# Altium footprint library ref-packages.PCBLIB: 1544 footprints (part 78 of 103)
Each footprint in its own frame and in the unit in brackets; x right, y up, seen from the top. Pads: shape width x height; smd on the part's side, far side on the other; paste and mask are expansions set on the pad; w line width, h text height; cw(c..) or ccw(c..) is an arc to the next point about the centre after c.
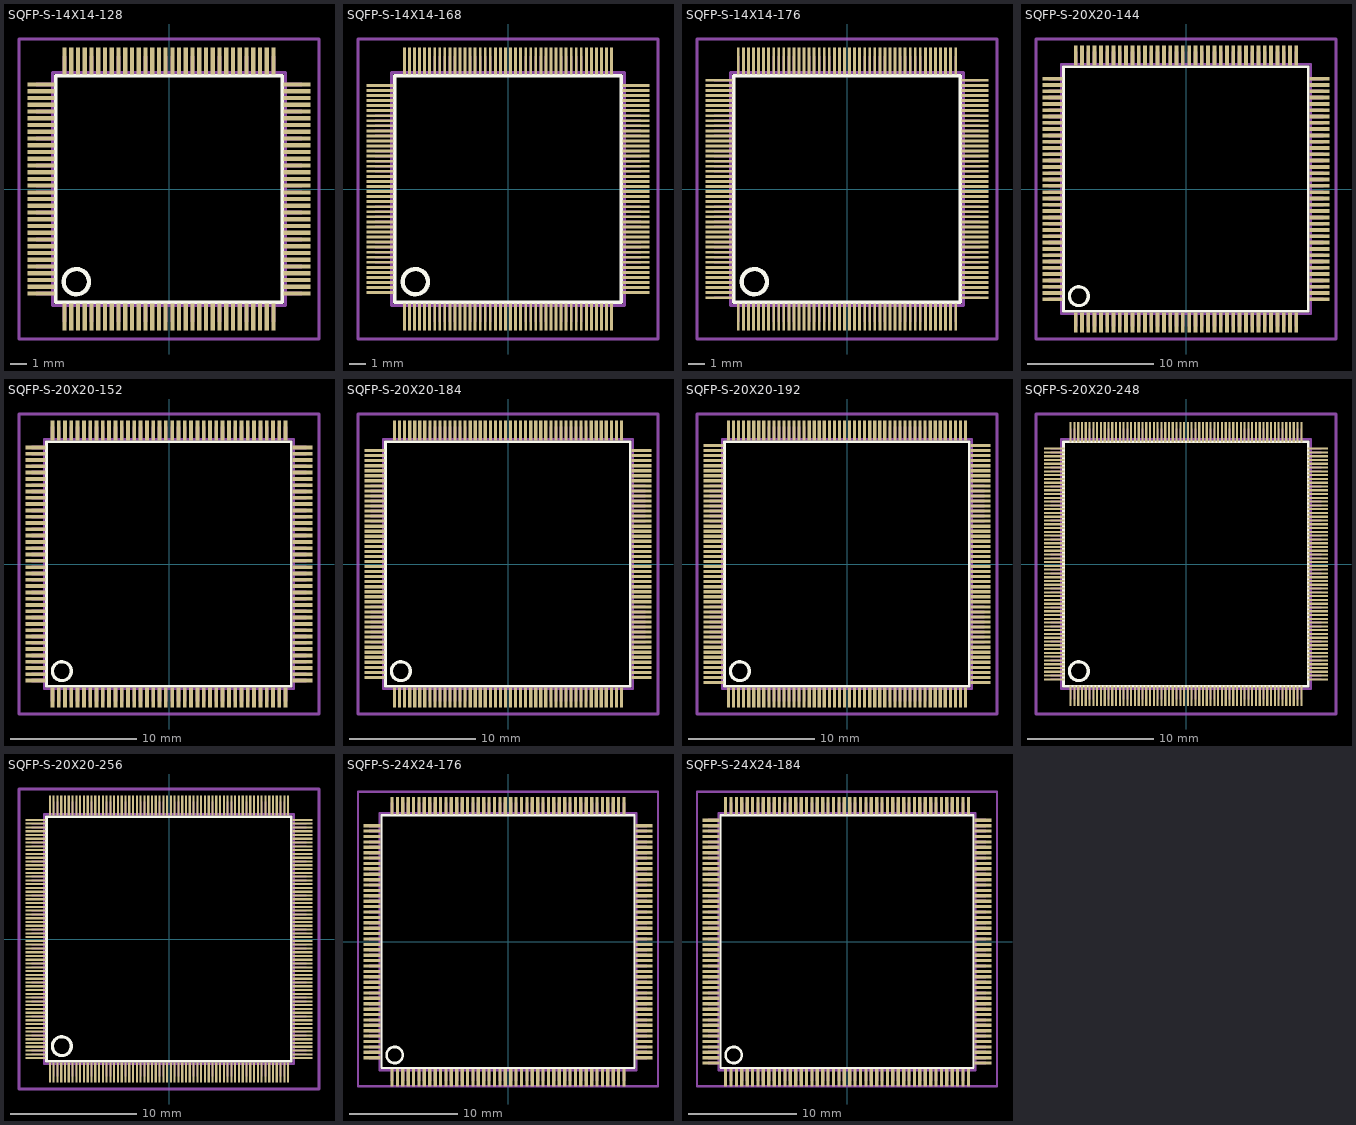
[diagram p77: the footprints below, top view; thin cyan lines are the x and y axes]

## SQFP-S-14X14-128 [mm]
pads (128):
  rect 0.25x1.6 smd: 1(-6.2,-7.6) 2(-5.8,-7.6) 3(-5.4,-7.6) 4(-5,-7.6) 5(-4.6,-7.6) 6(-4.2,-7.6) 7(-3.8,-7.6) 8(-3.4,-7.6) 9(-3,-7.6) 10(-2.6,-7.6) 11(-2.2,-7.6) 12(-1.8,-7.6) 13(-1.4,-7.6) 14(-1,-7.6) 15(-0.6,-7.6) 16(-0.2,-7.6) 17(0.2,-7.6) 18(0.6,-7.6) 19(1,-7.6) 20(1.4,-7.6) 21(1.8,-7.6) 22(2.2,-7.6) 23(2.6,-7.6) 24(3,-7.6) 25(3.4,-7.6) 26(3.8,-7.6) 27(4.2,-7.6) 28(4.6,-7.6) 29(5,-7.6) 30(5.4,-7.6) 31(5.8,-7.6) 32(6.2,-7.6) 65(6.2,7.6) 66(5.8,7.6) 67(5.4,7.6) 68(5,7.6) 69(4.6,7.6) 70(4.2,7.6) 71(3.8,7.6) 72(3.4,7.6) 73(3,7.6) 74(2.6,7.6) 75(2.2,7.6) 76(1.8,7.6) 77(1.4,7.6) 78(1,7.6) 79(0.6,7.6) 80(0.2,7.6) 81(-0.2,7.6) 82(-0.6,7.6) 83(-1,7.6) 84(-1.4,7.6) 85(-1.8,7.6) 86(-2.2,7.6) 87(-2.6,7.6) 88(-3,7.6) 89(-3.4,7.6) 90(-3.8,7.6) 91(-4.2,7.6) 92(-4.6,7.6) 93(-5,7.6) 94(-5.4,7.6) 95(-5.8,7.6) 96(-6.2,7.6)
  rect 1.6x0.25 smd: 33(7.6,-6.2) 34(7.6,-5.8) 35(7.6,-5.4) 36(7.6,-5) 37(7.6,-4.6) 38(7.6,-4.2) 39(7.6,-3.8) 40(7.6,-3.4) 41(7.6,-3) 42(7.6,-2.6) 43(7.6,-2.2) 44(7.6,-1.8) 45(7.6,-1.4) 46(7.6,-1) 47(7.6,-0.6) 48(7.6,-0.2) 49(7.6,0.2) 50(7.6,0.6) 51(7.6,1) 52(7.6,1.4) 53(7.6,1.8) 54(7.6,2.2) 55(7.6,2.6) 56(7.6,3) 57(7.6,3.4) 58(7.6,3.8) 59(7.6,4.2) 60(7.6,4.6) 61(7.6,5) 62(7.6,5.4) 63(7.6,5.8) 64(7.6,6.2) 97(-7.6,6.2) 98(-7.6,5.8) 99(-7.6,5.4) 100(-7.6,5) 101(-7.6,4.6) 102(-7.6,4.2) 103(-7.6,3.8) 104(-7.6,3.4) 105(-7.6,3) 106(-7.6,2.6) 107(-7.6,2.2) 108(-7.6,1.8) 109(-7.6,1.4) 110(-7.6,1) 111(-7.6,0.6) 112(-7.6,0.2) 113(-7.6,-0.2) 114(-7.6,-0.6) 115(-7.6,-1) 116(-7.6,-1.4) 117(-7.6,-1.8) 118(-7.6,-2.2) 119(-7.6,-2.6) 120(-7.6,-3) 121(-7.6,-3.4) 122(-7.6,-3.8) 123(-7.6,-4.2) 124(-7.6,-4.6) 125(-7.6,-5) 126(-7.6,-5.4) 127(-7.6,-5.8) 128(-7.6,-6.2)
Top Overlay:
  circle w0.254: c-5.5,-5.5 r0.75
  lines w0.203: -6.72,-6.71 6.71,-6.71 6.71,6.71 -6.72,6.71 -6.72,-6.71
Mechanical 16:
  rectangle: -6.31,-7.9 -6.09,-6.95
  rectangle: -5.91,-7.9 -5.69,-6.95
  rectangle: -5.51,-7.9 -5.29,-6.95
  rectangle: -5.11,-7.9 -4.89,-6.95
  rectangle: -4.71,-7.9 -4.49,-6.95
  rectangle: -4.31,-7.9 -4.09,-6.95
  rectangle: -3.91,-7.9 -3.69,-6.95
  rectangle: -3.51,-7.9 -3.29,-6.95
  rectangle: -3.11,-7.9 -2.89,-6.95
  rectangle: -2.71,-7.9 -2.49,-6.95
  rectangle: -2.31,-7.9 -2.09,-6.95
  rectangle: -1.91,-7.9 -1.69,-6.95
  rectangle: -1.51,-7.9 -1.29,-6.95
  rectangle: -1.11,-7.9 -0.89,-6.95
  rectangle: -0.71,-7.9 -0.49,-6.95
  rectangle: -0.31,-7.9 -0.09,-6.95
  rectangle: 0.09,-7.9 0.31,-6.95
  rectangle: 0.49,-7.9 0.71,-6.95
  rectangle: 0.89,-7.9 1.11,-6.95
  rectangle: 1.29,-7.9 1.51,-6.95
  rectangle: 1.69,-7.9 1.91,-6.95
  rectangle: 2.09,-7.9 2.31,-6.95
  rectangle: 2.49,-7.9 2.71,-6.95
  rectangle: 2.89,-7.9 3.11,-6.95
  rectangle: 3.29,-7.9 3.51,-6.95
  rectangle: 3.69,-7.9 3.91,-6.95
  rectangle: 4.09,-7.9 4.31,-6.95
  rectangle: 4.49,-7.9 4.71,-6.95
  rectangle: 4.89,-7.9 5.11,-6.95
  rectangle: 5.29,-7.9 5.51,-6.95
  rectangle: 5.69,-7.9 5.91,-6.95
  rectangle: 6.09,-7.9 6.31,-6.95
  rectangle: 6.95,-6.31 7.9,-6.09
  rectangle: 6.95,-5.91 7.9,-5.69
  rectangle: 6.95,-5.51 7.9,-5.29
  rectangle: 6.95,-5.11 7.9,-4.89
  rectangle: 6.95,-4.71 7.9,-4.49
  rectangle: 6.95,-4.31 7.9,-4.09
  rectangle: 6.95,-3.91 7.9,-3.69
  rectangle: 6.95,-3.51 7.9,-3.29
  rectangle: 6.95,-3.11 7.9,-2.89
  rectangle: 6.95,-2.71 7.9,-2.49
  rectangle: 6.95,-2.31 7.9,-2.09
  rectangle: 6.95,-1.91 7.9,-1.69
  rectangle: 6.95,-1.51 7.9,-1.29
  rectangle: 6.95,-1.11 7.9,-0.89
  rectangle: 6.95,-0.71 7.9,-0.49
  rectangle: 6.95,-0.31 7.9,-0.09
  rectangle: 6.95,0.09 7.9,0.31
  rectangle: 6.95,0.49 7.9,0.71
  rectangle: 6.95,0.89 7.9,1.11
  rectangle: 6.95,1.29 7.9,1.51
  rectangle: 6.95,1.69 7.9,1.91
  rectangle: 6.95,2.09 7.9,2.31
  rectangle: 6.95,2.49 7.9,2.71
  rectangle: 6.95,2.89 7.9,3.11
  rectangle: 6.95,3.29 7.9,3.51
  rectangle: 6.95,3.69 7.9,3.91
  rectangle: 6.95,4.09 7.9,4.31
  rectangle: 6.95,4.49 7.9,4.71
  rectangle: 6.95,4.89 7.9,5.11
  rectangle: 6.95,5.29 7.9,5.51
  rectangle: 6.95,5.69 7.9,5.91
  rectangle: 6.95,6.09 7.9,6.31
  rectangle: 6.09,6.95 6.31,7.9
  rectangle: 5.69,6.95 5.91,7.9
  rectangle: 5.29,6.95 5.51,7.9
  rectangle: 4.89,6.95 5.11,7.9
  rectangle: 4.49,6.95 4.71,7.9
  rectangle: 4.09,6.95 4.31,7.9
  rectangle: 3.69,6.95 3.91,7.9
  rectangle: 3.29,6.95 3.51,7.9
  rectangle: 2.89,6.95 3.11,7.9
  rectangle: 2.49,6.95 2.71,7.9
  rectangle: 2.09,6.95 2.31,7.9
  rectangle: 1.69,6.95 1.91,7.9
  rectangle: 1.29,6.95 1.51,7.9
  rectangle: 0.89,6.95 1.11,7.9
  rectangle: 0.49,6.95 0.71,7.9
  rectangle: 0.09,6.95 0.31,7.9
  rectangle: -0.31,6.95 -0.09,7.9
  rectangle: -0.71,6.95 -0.49,7.9
  rectangle: -1.11,6.95 -0.89,7.9
  rectangle: -1.51,6.95 -1.29,7.9
  rectangle: -1.91,6.95 -1.69,7.9
  rectangle: -2.31,6.95 -2.09,7.9
  rectangle: -2.71,6.95 -2.49,7.9
  rectangle: -3.11,6.95 -2.89,7.9
  rectangle: -3.51,6.95 -3.29,7.9
  rectangle: -3.91,6.95 -3.69,7.9
  rectangle: -4.31,6.95 -4.09,7.9
  rectangle: -4.71,6.95 -4.49,7.9
  rectangle: -5.11,6.95 -4.89,7.9
  rectangle: -5.51,6.95 -5.29,7.9
  rectangle: -5.91,6.95 -5.69,7.9
  rectangle: -6.31,6.95 -6.09,7.9
  rectangle: -7.9,6.09 -6.95,6.31
  rectangle: -7.9,5.69 -6.95,5.91
  rectangle: -7.9,5.29 -6.95,5.51
  rectangle: -7.9,4.89 -6.95,5.11
  rectangle: -7.9,4.49 -6.95,4.71
  rectangle: -7.9,4.09 -6.95,4.31
  rectangle: -7.9,3.69 -6.95,3.91
  rectangle: -7.9,3.29 -6.95,3.51
  rectangle: -7.9,2.89 -6.95,3.11
  rectangle: -7.9,2.49 -6.95,2.71
  rectangle: -7.9,2.09 -6.95,2.31
  rectangle: -7.9,1.69 -6.95,1.91
  rectangle: -7.9,1.29 -6.95,1.51
  rectangle: -7.9,0.89 -6.95,1.11
  rectangle: -7.9,0.49 -6.95,0.71
  rectangle: -7.9,0.09 -6.95,0.31
  rectangle: -7.9,-0.31 -6.95,-0.09
  rectangle: -7.9,-0.71 -6.95,-0.49
  rectangle: -7.9,-1.11 -6.95,-0.89
  rectangle: -7.9,-1.51 -6.95,-1.29
  rectangle: -7.9,-1.91 -6.95,-1.69
  rectangle: -7.9,-2.31 -6.95,-2.09
  rectangle: -7.9,-2.71 -6.95,-2.49
  rectangle: -7.9,-3.11 -6.95,-2.89
  rectangle: -7.9,-3.51 -6.95,-3.29
  rectangle: -7.9,-3.91 -6.95,-3.69
  rectangle: -7.9,-4.31 -6.95,-4.09
  rectangle: -7.9,-4.71 -6.95,-4.49
  rectangle: -7.9,-5.11 -6.95,-4.89
  rectangle: -7.9,-5.51 -6.95,-5.29
  rectangle: -7.9,-5.91 -6.95,-5.69
  rectangle: -7.9,-6.31 -6.95,-6.09
  lines w0.203: -6.91,-6.91 6.91,-6.91 6.91,6.91 -6.91,6.91 -6.91,-6.91
Mechanical 27:
  lines w0.2: -8.9,-8.9 -8.9,8.9 8.9,8.9 8.9,-8.9 -8.9,-8.9

## SQFP-S-14X14-168 [mm]
pads (168):
  rect 0.17x1.6 smd: 1(-6.15,-7.6) 2(-5.85,-7.6) 3(-5.55,-7.6) 4(-5.25,-7.6) 5(-4.95,-7.6) 6(-4.65,-7.6) 7(-4.35,-7.6) 8(-4.05,-7.6) 9(-3.75,-7.6) 10(-3.45,-7.6) 11(-3.15,-7.6) 12(-2.85,-7.6) 13(-2.55,-7.6) 14(-2.25,-7.6) 15(-1.95,-7.6) 16(-1.65,-7.6) 17(-1.35,-7.6) 18(-1.05,-7.6) 19(-0.75,-7.6) 20(-0.45,-7.6) 21(-0.15,-7.6) 22(0.15,-7.6) 23(0.45,-7.6) 24(0.75,-7.6) 25(1.05,-7.6) 26(1.35,-7.6) 27(1.65,-7.6) 28(1.95,-7.6) 29(2.25,-7.6) 30(2.55,-7.6) 31(2.85,-7.6) 32(3.15,-7.6) 33(3.45,-7.6) 34(3.75,-7.6) 35(4.05,-7.6) 36(4.35,-7.6) 37(4.65,-7.6) 38(4.95,-7.6) 39(5.25,-7.6) 40(5.55,-7.6) 41(5.85,-7.6) 42(6.15,-7.6) 85(6.15,7.6) 86(5.85,7.6) 87(5.55,7.6) 88(5.25,7.6) 89(4.95,7.6) 90(4.65,7.6) 91(4.35,7.6) 92(4.05,7.6) 93(3.75,7.6) 94(3.45,7.6) 95(3.15,7.6) 96(2.85,7.6) 97(2.55,7.6) 98(2.25,7.6) 99(1.95,7.6) 100(1.65,7.6) 101(1.35,7.6) 102(1.05,7.6) 103(0.75,7.6) 104(0.45,7.6) 105(0.15,7.6) 106(-0.15,7.6) 107(-0.45,7.6) 108(-0.75,7.6) 109(-1.05,7.6) 110(-1.35,7.6) 111(-1.65,7.6) 112(-1.95,7.6) 113(-2.25,7.6) 114(-2.55,7.6) 115(-2.85,7.6) 116(-3.15,7.6) 117(-3.45,7.6) 118(-3.75,7.6) 119(-4.05,7.6) 120(-4.35,7.6) 121(-4.65,7.6) 122(-4.95,7.6) 123(-5.25,7.6) 124(-5.55,7.6) 125(-5.85,7.6) 126(-6.15,7.6)
  rect 1.6x0.17 smd: 43(7.6,-6.15) 44(7.6,-5.85) 45(7.6,-5.55) 46(7.6,-5.25) 47(7.6,-4.95) 48(7.6,-4.65) 49(7.6,-4.35) 50(7.6,-4.05) 51(7.6,-3.75) 52(7.6,-3.45) 53(7.6,-3.15) 54(7.6,-2.85) 55(7.6,-2.55) 56(7.6,-2.25) 57(7.6,-1.95) 58(7.6,-1.65) 59(7.6,-1.35) 60(7.6,-1.05) 61(7.6,-0.75) 62(7.6,-0.45) 63(7.6,-0.15) 64(7.6,0.15) 65(7.6,0.45) 66(7.6,0.75) 67(7.6,1.05) 68(7.6,1.35) 69(7.6,1.65) 70(7.6,1.95) 71(7.6,2.25) 72(7.6,2.55) 73(7.6,2.85) 74(7.6,3.15) 75(7.6,3.45) 76(7.6,3.75) 77(7.6,4.05) 78(7.6,4.35) 79(7.6,4.65) 80(7.6,4.95) 81(7.6,5.25) 82(7.6,5.55) 83(7.6,5.85) 84(7.6,6.15) 127(-7.6,6.15) 128(-7.6,5.85) 129(-7.6,5.55) 130(-7.6,5.25) 131(-7.6,4.95) 132(-7.6,4.65) 133(-7.6,4.35) 134(-7.6,4.05) 135(-7.6,3.75) 136(-7.6,3.45) 137(-7.6,3.15) 138(-7.6,2.85) 139(-7.6,2.55) 140(-7.6,2.25) 141(-7.6,1.95) 142(-7.6,1.65) 143(-7.6,1.35) 144(-7.6,1.05) 145(-7.6,0.75) 146(-7.6,0.45) 147(-7.6,0.15) 148(-7.6,-0.15) 149(-7.6,-0.45) 150(-7.6,-0.75) 151(-7.6,-1.05) 152(-7.6,-1.35) 153(-7.6,-1.65) 154(-7.6,-1.95) 155(-7.6,-2.25) 156(-7.6,-2.55) 157(-7.6,-2.85) 158(-7.6,-3.15) 159(-7.6,-3.45) 160(-7.6,-3.75) 161(-7.6,-4.05) 162(-7.6,-4.35) 163(-7.6,-4.65) 164(-7.6,-4.95) 165(-7.6,-5.25) 166(-7.6,-5.55) 167(-7.6,-5.85) 168(-7.6,-6.15)
Top Overlay:
  circle w0.254: c-5.5,-5.5 r0.75
  lines w0.203: -6.72,-6.71 6.71,-6.71 6.71,6.71 -6.72,6.71 -6.72,-6.71
Mechanical 16:
  drawing of 172 lines, arcs and shapes, not listed
Mechanical 27:
  lines w0.2: -8.9,-8.9 -8.9,8.9 8.9,8.9 8.9,-8.9 -8.9,-8.9

## SQFP-S-14X14-176 [mm]
pads (176):
  rect 0.17x1.6 smd: 1(-6.45,-7.6) 2(-6.15,-7.6) 3(-5.85,-7.6) 4(-5.55,-7.6) 5(-5.25,-7.6) 6(-4.95,-7.6) 7(-4.65,-7.6) 8(-4.35,-7.6) 9(-4.05,-7.6) 10(-3.75,-7.6) 11(-3.45,-7.6) 12(-3.15,-7.6) 13(-2.85,-7.6) 14(-2.55,-7.6) 15(-2.25,-7.6) 16(-1.95,-7.6) 17(-1.65,-7.6) 18(-1.35,-7.6) 19(-1.05,-7.6) 20(-0.75,-7.6) 21(-0.45,-7.6) 22(-0.15,-7.6) 23(0.15,-7.6) 24(0.45,-7.6) 25(0.75,-7.6) 26(1.05,-7.6) 27(1.35,-7.6) 28(1.65,-7.6) 29(1.95,-7.6) 30(2.25,-7.6) 31(2.55,-7.6) 32(2.85,-7.6) 33(3.15,-7.6) 34(3.45,-7.6) 35(3.75,-7.6) 36(4.05,-7.6) 37(4.35,-7.6) 38(4.65,-7.6) 39(4.95,-7.6) 40(5.25,-7.6) 41(5.55,-7.6) 42(5.85,-7.6) 43(6.15,-7.6) 44(6.45,-7.6) 89(6.45,7.6) 90(6.15,7.6) 91(5.85,7.6) 92(5.55,7.6) 93(5.25,7.6) 94(4.95,7.6) 95(4.65,7.6) 96(4.35,7.6) 97(4.05,7.6) 98(3.75,7.6) 99(3.45,7.6) 100(3.15,7.6) 101(2.85,7.6) 102(2.55,7.6) 103(2.25,7.6) 104(1.95,7.6) 105(1.65,7.6) 106(1.35,7.6) 107(1.05,7.6) 108(0.75,7.6) 109(0.45,7.6) 110(0.15,7.6) 111(-0.15,7.6) 112(-0.45,7.6) 113(-0.75,7.6) 114(-1.05,7.6) 115(-1.35,7.6) 116(-1.65,7.6) 117(-1.95,7.6) 118(-2.25,7.6) 119(-2.55,7.6) 120(-2.85,7.6) 121(-3.15,7.6) 122(-3.45,7.6) 123(-3.75,7.6) 124(-4.05,7.6) 125(-4.35,7.6) 126(-4.65,7.6) 127(-4.95,7.6) 128(-5.25,7.6) 129(-5.55,7.6) 130(-5.85,7.6) 131(-6.15,7.6) 132(-6.45,7.6)
  rect 1.6x0.17 smd: 45(7.6,-6.45) 46(7.6,-6.15) 47(7.6,-5.85) 48(7.6,-5.55) 49(7.6,-5.25) 50(7.6,-4.95) 51(7.6,-4.65) 52(7.6,-4.35) 53(7.6,-4.05) 54(7.6,-3.75) 55(7.6,-3.45) 56(7.6,-3.15) 57(7.6,-2.85) 58(7.6,-2.55) 59(7.6,-2.25) 60(7.6,-1.95) 61(7.6,-1.65) 62(7.6,-1.35) 63(7.6,-1.05) 64(7.6,-0.75) 65(7.6,-0.45) 66(7.6,-0.15) 67(7.6,0.15) 68(7.6,0.45) 69(7.6,0.75) 70(7.6,1.05) 71(7.6,1.35) 72(7.6,1.65) 73(7.6,1.95) 74(7.6,2.25) 75(7.6,2.55) 76(7.6,2.85) 77(7.6,3.15) 78(7.6,3.45) 79(7.6,3.75) 80(7.6,4.05) 81(7.6,4.35) 82(7.6,4.65) 83(7.6,4.95) 84(7.6,5.25) 85(7.6,5.55) 86(7.6,5.85) 87(7.6,6.15) 88(7.6,6.45) 133(-7.6,6.45) 134(-7.6,6.15) 135(-7.6,5.85) 136(-7.6,5.55) 137(-7.6,5.25) 138(-7.6,4.95) 139(-7.6,4.65) 140(-7.6,4.35) 141(-7.6,4.05) 142(-7.6,3.75) 143(-7.6,3.45) 144(-7.6,3.15) 145(-7.6,2.85) 146(-7.6,2.55) 147(-7.6,2.25) 148(-7.6,1.95) 149(-7.6,1.65) 150(-7.6,1.35) 151(-7.6,1.05) 152(-7.6,0.75) 153(-7.6,0.45) 154(-7.6,0.15) 155(-7.6,-0.15) 156(-7.6,-0.45) 157(-7.6,-0.75) 158(-7.6,-1.05) 159(-7.6,-1.35) 160(-7.6,-1.65) 161(-7.6,-1.95) 162(-7.6,-2.25) 163(-7.6,-2.55) 164(-7.6,-2.85) 165(-7.6,-3.15) 166(-7.6,-3.45) 167(-7.6,-3.75) 168(-7.6,-4.05) 169(-7.6,-4.35) 170(-7.6,-4.65) 171(-7.6,-4.95) 172(-7.6,-5.25) 173(-7.6,-5.55) 174(-7.6,-5.85) 175(-7.6,-6.15) 176(-7.6,-6.45)
Top Overlay:
  circle w0.254: c-5.5,-5.5 r0.75
  lines w0.203: -6.72,-6.71 6.71,-6.71 6.71,6.71 -6.72,6.71 -6.72,-6.71
Mechanical 16:
  drawing of 180 lines, arcs and shapes, not listed
Mechanical 27:
  lines w0.2: -8.9,-8.9 -8.9,8.9 8.9,8.9 8.9,-8.9 -8.9,-8.9

## SQFP-S-20X20-144 [mil]
pads (144):
  rect 11.81x62.99 smd: 1(-344.49,-417.32) 2(-324.8,-417.32) 3(-305.12,-417.32) 4(-285.43,-417.32) 5(-265.75,-417.32) 6(-246.06,-417.32) 7(-226.38,-417.32) 8(-206.69,-417.32) 9(-187.01,-417.32) 10(-167.32,-417.32) 11(-147.64,-417.32) 12(-127.95,-417.32) 13(-108.27,-417.32) 14(-88.58,-417.32) 15(-68.9,-417.32) 16(-49.21,-417.32) 17(-29.53,-417.32) 18(-9.84,-417.32) 19(9.84,-417.32) 20(29.53,-417.32) 21(49.21,-417.32) 22(68.9,-417.32) 23(88.58,-417.32) 24(108.27,-417.32) 25(127.95,-417.32) 26(147.64,-417.32) 27(167.32,-417.32) 28(187.01,-417.32) 29(206.69,-417.32) 30(226.38,-417.32) 31(246.06,-417.32) 32(265.75,-417.32) 33(285.43,-417.32) 34(305.12,-417.32) 35(324.8,-417.32) 36(344.49,-417.32) 73(344.49,417.32) 74(324.8,417.32) 75(305.12,417.32) 76(285.43,417.32) 77(265.75,417.32) 78(246.06,417.32) 79(226.38,417.32) 80(206.69,417.32) 81(187.01,417.32) 82(167.32,417.32) 83(147.64,417.32) 84(127.95,417.32) 85(108.27,417.32) 86(88.58,417.32) 87(68.9,417.32) 88(49.21,417.32) 89(29.53,417.32) 90(9.84,417.32) 91(-9.84,417.32) 92(-29.53,417.32) 93(-49.21,417.32) 94(-68.9,417.32) 95(-88.58,417.32) 96(-108.27,417.32) 97(-127.95,417.32) 98(-147.64,417.32) 99(-167.32,417.32) 100(-187.01,417.32) 101(-206.69,417.32) 102(-226.38,417.32) 103(-246.06,417.32) 104(-265.75,417.32) 105(-285.43,417.32) 106(-305.12,417.32) 107(-324.8,417.32) 108(-344.49,417.32)
  rect 62.99x11.81 smd: 37(417.32,-344.49) 38(417.32,-324.8) 39(417.32,-305.12) 40(417.32,-285.43) 41(417.32,-265.75) 42(417.32,-246.06) 43(417.32,-226.38) 44(417.32,-206.69) 45(417.32,-187.01) 46(417.32,-167.32) 47(417.32,-147.64) 48(417.32,-127.95) 49(417.32,-108.27) 50(417.32,-88.58) 51(417.32,-68.9) 52(417.32,-49.21) 53(417.32,-29.53) 54(417.32,-9.84) 55(417.32,9.84) 56(417.32,29.53) 57(417.32,49.21) 58(417.32,68.9) 59(417.32,88.58) 60(417.32,108.27) 61(417.32,127.95) 62(417.32,147.64) 63(417.32,167.32) 64(417.32,187.01) 65(417.32,206.69) 66(417.32,226.38) 67(417.32,246.06) 68(417.32,265.75) 69(417.32,285.43) 70(417.32,305.12) 71(417.32,324.8) 72(417.32,344.49) 109(-417.32,344.49) 110(-417.32,324.8) 111(-417.32,305.12) 112(-417.32,285.43) 113(-417.32,265.75) 114(-417.32,246.06) 115(-417.32,226.38) 116(-417.32,206.69) 117(-417.32,187.01) 118(-417.32,167.32) 119(-417.32,147.64) 120(-417.32,127.95) 121(-417.32,108.27) 122(-417.32,88.58) 123(-417.32,68.9) 124(-417.32,49.21) 125(-417.32,29.53) 126(-417.32,9.84) 127(-417.32,-9.84) 128(-417.32,-29.53) 129(-417.32,-49.21) 130(-417.32,-68.9) 131(-417.32,-88.58) 132(-417.32,-108.27) 133(-417.32,-127.95) 134(-417.32,-147.64) 135(-417.32,-167.32) 136(-417.32,-187.01) 137(-417.32,-206.69) 138(-417.32,-226.38) 139(-417.32,-246.06) 140(-417.32,-265.75) 141(-417.32,-285.43) 142(-417.32,-305.12) 143(-417.32,-324.8) 144(-417.32,-344.49)
Top Overlay:
  circle w10: c-334.65,-334.65 r29.53
  lines w8: -382.68,-382.28 382.28,-382.28 382.28,382.28 -382.68,382.28 -382.68,-382.28
Mechanical 16:
  rectangle: -350.39,-429.13 -338.58,-391.73
  rectangle: -330.71,-429.13 -318.9,-391.73
  rectangle: -311.02,-429.13 -299.21,-391.73
  rectangle: -291.34,-429.13 -279.53,-391.73
  rectangle: -271.65,-429.13 -259.84,-391.73
  rectangle: -251.97,-429.13 -240.16,-391.73
  rectangle: -232.28,-429.13 -220.47,-391.73
  rectangle: -212.6,-429.13 -200.79,-391.73
  rectangle: -192.91,-429.13 -181.1,-391.73
  rectangle: -173.23,-429.13 -161.42,-391.73
  rectangle: -153.54,-429.13 -141.73,-391.73
  rectangle: -133.86,-429.13 -122.05,-391.73
  rectangle: -114.17,-429.13 -102.36,-391.73
  rectangle: -94.49,-429.13 -82.68,-391.73
  rectangle: -74.8,-429.13 -62.99,-391.73
  rectangle: -55.12,-429.13 -43.31,-391.73
  rectangle: -35.43,-429.13 -23.62,-391.73
  rectangle: -15.75,-429.13 -3.94,-391.73
  rectangle: 3.94,-429.13 15.75,-391.73
  rectangle: 23.62,-429.13 35.43,-391.73
  rectangle: 43.31,-429.13 55.12,-391.73
  rectangle: 62.99,-429.13 74.8,-391.73
  rectangle: 82.68,-429.13 94.49,-391.73
  rectangle: 102.36,-429.13 114.17,-391.73
  rectangle: 122.05,-429.13 133.86,-391.73
  rectangle: 141.73,-429.13 153.54,-391.73
  rectangle: 161.42,-429.13 173.23,-391.73
  rectangle: 181.1,-429.13 192.91,-391.73
  rectangle: 200.79,-429.13 212.6,-391.73
  rectangle: 220.47,-429.13 232.28,-391.73
  rectangle: 240.16,-429.13 251.97,-391.73
  rectangle: 259.84,-429.13 271.65,-391.73
  rectangle: 279.53,-429.13 291.34,-391.73
  rectangle: 299.21,-429.13 311.02,-391.73
  rectangle: 318.9,-429.13 330.71,-391.73
  rectangle: 338.58,-429.13 350.39,-391.73
  rectangle: 391.73,-350.39 429.13,-338.58
  rectangle: 391.73,-330.71 429.13,-318.9
  rectangle: 391.73,-311.02 429.13,-299.21
  rectangle: 391.73,-291.34 429.13,-279.53
  rectangle: 391.73,-271.65 429.13,-259.84
  rectangle: 391.73,-251.97 429.13,-240.16
  rectangle: 391.73,-232.28 429.13,-220.47
  rectangle: 391.73,-212.6 429.13,-200.79
  rectangle: 391.73,-192.91 429.13,-181.1
  rectangle: 391.73,-173.23 429.13,-161.42
  rectangle: 391.73,-153.54 429.13,-141.73
  rectangle: 391.73,-133.86 429.13,-122.05
  rectangle: 391.73,-114.17 429.13,-102.36
  rectangle: 391.73,-94.49 429.13,-82.68
  rectangle: 391.73,-74.8 429.13,-62.99
  rectangle: 391.73,-55.12 429.13,-43.31
  rectangle: 391.73,-35.43 429.13,-23.62
  rectangle: 391.73,-15.75 429.13,-3.94
  rectangle: 391.73,3.94 429.13,15.75
  rectangle: 391.73,23.62 429.13,35.43
  rectangle: 391.73,43.31 429.13,55.12
  rectangle: 391.73,62.99 429.13,74.8
  rectangle: 391.73,82.68 429.13,94.49
  rectangle: 391.73,102.36 429.13,114.17
  rectangle: 391.73,122.05 429.13,133.86
  rectangle: 391.73,141.73 429.13,153.54
  rectangle: 391.73,161.42 429.13,173.23
  rectangle: 391.73,181.1 429.13,192.91
  rectangle: 391.73,200.79 429.13,212.6
  rectangle: 391.73,220.47 429.13,232.28
  rectangle: 391.73,240.16 429.13,251.97
  rectangle: 391.73,259.84 429.13,271.65
  rectangle: 391.73,279.53 429.13,291.34
  rectangle: 391.73,299.21 429.13,311.02
  rectangle: 391.73,318.9 429.13,330.71
  rectangle: 391.73,338.58 429.13,350.39
  rectangle: 338.58,391.73 350.39,429.13
  rectangle: 318.9,391.73 330.71,429.13
  rectangle: 299.21,391.73 311.02,429.13
  rectangle: 279.53,391.73 291.34,429.13
  rectangle: 259.84,391.73 271.65,429.13
  rectangle: 240.16,391.73 251.97,429.13
  rectangle: 220.47,391.73 232.28,429.13
  rectangle: 200.79,391.73 212.6,429.13
  rectangle: 181.1,391.73 192.91,429.13
  rectangle: 161.42,391.73 173.23,429.13
  rectangle: 141.73,391.73 153.54,429.13
  rectangle: 122.05,391.73 133.86,429.13
  rectangle: 102.36,391.73 114.17,429.13
  rectangle: 82.68,391.73 94.49,429.13
  rectangle: 62.99,391.73 74.8,429.13
  rectangle: 43.31,391.73 55.12,429.13
  rectangle: 23.62,391.73 35.43,429.13
  rectangle: 3.94,391.73 15.75,429.13
  rectangle: -15.75,391.73 -3.94,429.13
  rectangle: -35.43,391.73 -23.62,429.13
  rectangle: -55.12,391.73 -43.31,429.13
  rectangle: -74.8,391.73 -62.99,429.13
  rectangle: -94.49,391.73 -82.68,429.13
  rectangle: -114.17,391.73 -102.36,429.13
  rectangle: -133.86,391.73 -122.05,429.13
  rectangle: -153.54,391.73 -141.73,429.13
  rectangle: -173.23,391.73 -161.42,429.13
  rectangle: -192.91,391.73 -181.1,429.13
  rectangle: -212.6,391.73 -200.79,429.13
  rectangle: -232.28,391.73 -220.47,429.13
  rectangle: -251.97,391.73 -240.16,429.13
  rectangle: -271.65,391.73 -259.84,429.13
  rectangle: -291.34,391.73 -279.53,429.13
  rectangle: -311.02,391.73 -299.21,429.13
  rectangle: -330.71,391.73 -318.9,429.13
  rectangle: -350.39,391.73 -338.58,429.13
  rectangle: -429.13,338.58 -391.73,350.39
  rectangle: -429.13,318.9 -391.73,330.71
  rectangle: -429.13,299.21 -391.73,311.02
  rectangle: -429.13,279.53 -391.73,291.34
  rectangle: -429.13,259.84 -391.73,271.65
  rectangle: -429.13,240.16 -391.73,251.97
  rectangle: -429.13,220.47 -391.73,232.28
  rectangle: -429.13,200.79 -391.73,212.6
  rectangle: -429.13,181.1 -391.73,192.91
  rectangle: -429.13,161.42 -391.73,173.23
  rectangle: -429.13,141.73 -391.73,153.54
  rectangle: -429.13,122.05 -391.73,133.86
  rectangle: -429.13,102.36 -391.73,114.17
  rectangle: -429.13,82.68 -391.73,94.49
  rectangle: -429.13,62.99 -391.73,74.8
  rectangle: -429.13,43.31 -391.73,55.12
  rectangle: -429.13,23.62 -391.73,35.43
  rectangle: -429.13,3.94 -391.73,15.75
  rectangle: -429.13,-15.75 -391.73,-3.94
  rectangle: -429.13,-35.43 -391.73,-23.62
  rectangle: -429.13,-55.12 -391.73,-43.31
  rectangle: -429.13,-74.8 -391.73,-62.99
  rectangle: -429.13,-94.49 -391.73,-82.68
  rectangle: -429.13,-114.17 -391.73,-102.36
  rectangle: -429.13,-133.86 -391.73,-122.05
  rectangle: -429.13,-153.54 -391.73,-141.73
  rectangle: -429.13,-173.23 -391.73,-161.42
  rectangle: -429.13,-192.91 -391.73,-181.1
  rectangle: -429.13,-212.6 -391.73,-200.79
  rectangle: -429.13,-232.28 -391.73,-220.47
  rectangle: -429.13,-251.97 -391.73,-240.16
  rectangle: -429.13,-271.65 -391.73,-259.84
  rectangle: -429.13,-291.34 -391.73,-279.53
  rectangle: -429.13,-311.02 -391.73,-299.21
  rectangle: -429.13,-330.71 -391.73,-318.9
  rectangle: -429.13,-350.39 -391.73,-338.58
  lines w8: -390.16,-390.16 390.16,-390.16 390.16,390.16 -390.16,390.16 -390.16,-390.16
Mechanical 27:
  lines w7.87: -468.5,-468.5 -468.5,468.5 468.5,468.5 468.5,-468.5 -468.5,-468.5
